# Altium schematic symbol library ICs.SchLib: 803 symbols (part 22 of 22) (continued)
## nRF52810
designator U?
MCU; Value: 64MHz; Type: QFN48 P0.4
footprint QFN_P0.5_32
part A pins: 1 DEC1, 9 VDD_1, 17 SWDCLK, 18 SWDIO, 19 ANT, 20 VSS_1, 21 DEC2, 22 DEC3, 23 XC1, 24 XC2, 25 VDD_2, 29 VSS_2, 30 DEC4, 31 DCC, 32 VDD_3, 33 PAD
part B pins: 2 P0.00/XL1, 3 P0.01/XL2, 4 P0.04/AIN2, 5 P0.05/AIN3, 6 P0.06, 7 P0.09, 8 P0.10, 10 P0.12, 11 P0.14, 12 P0.15, 13 P0.16, 14 P0.18, 15 P0.20, 16 P0.21, 26 P0.25, 27 P0.28/AIN4, 28 P0.30/AIN6

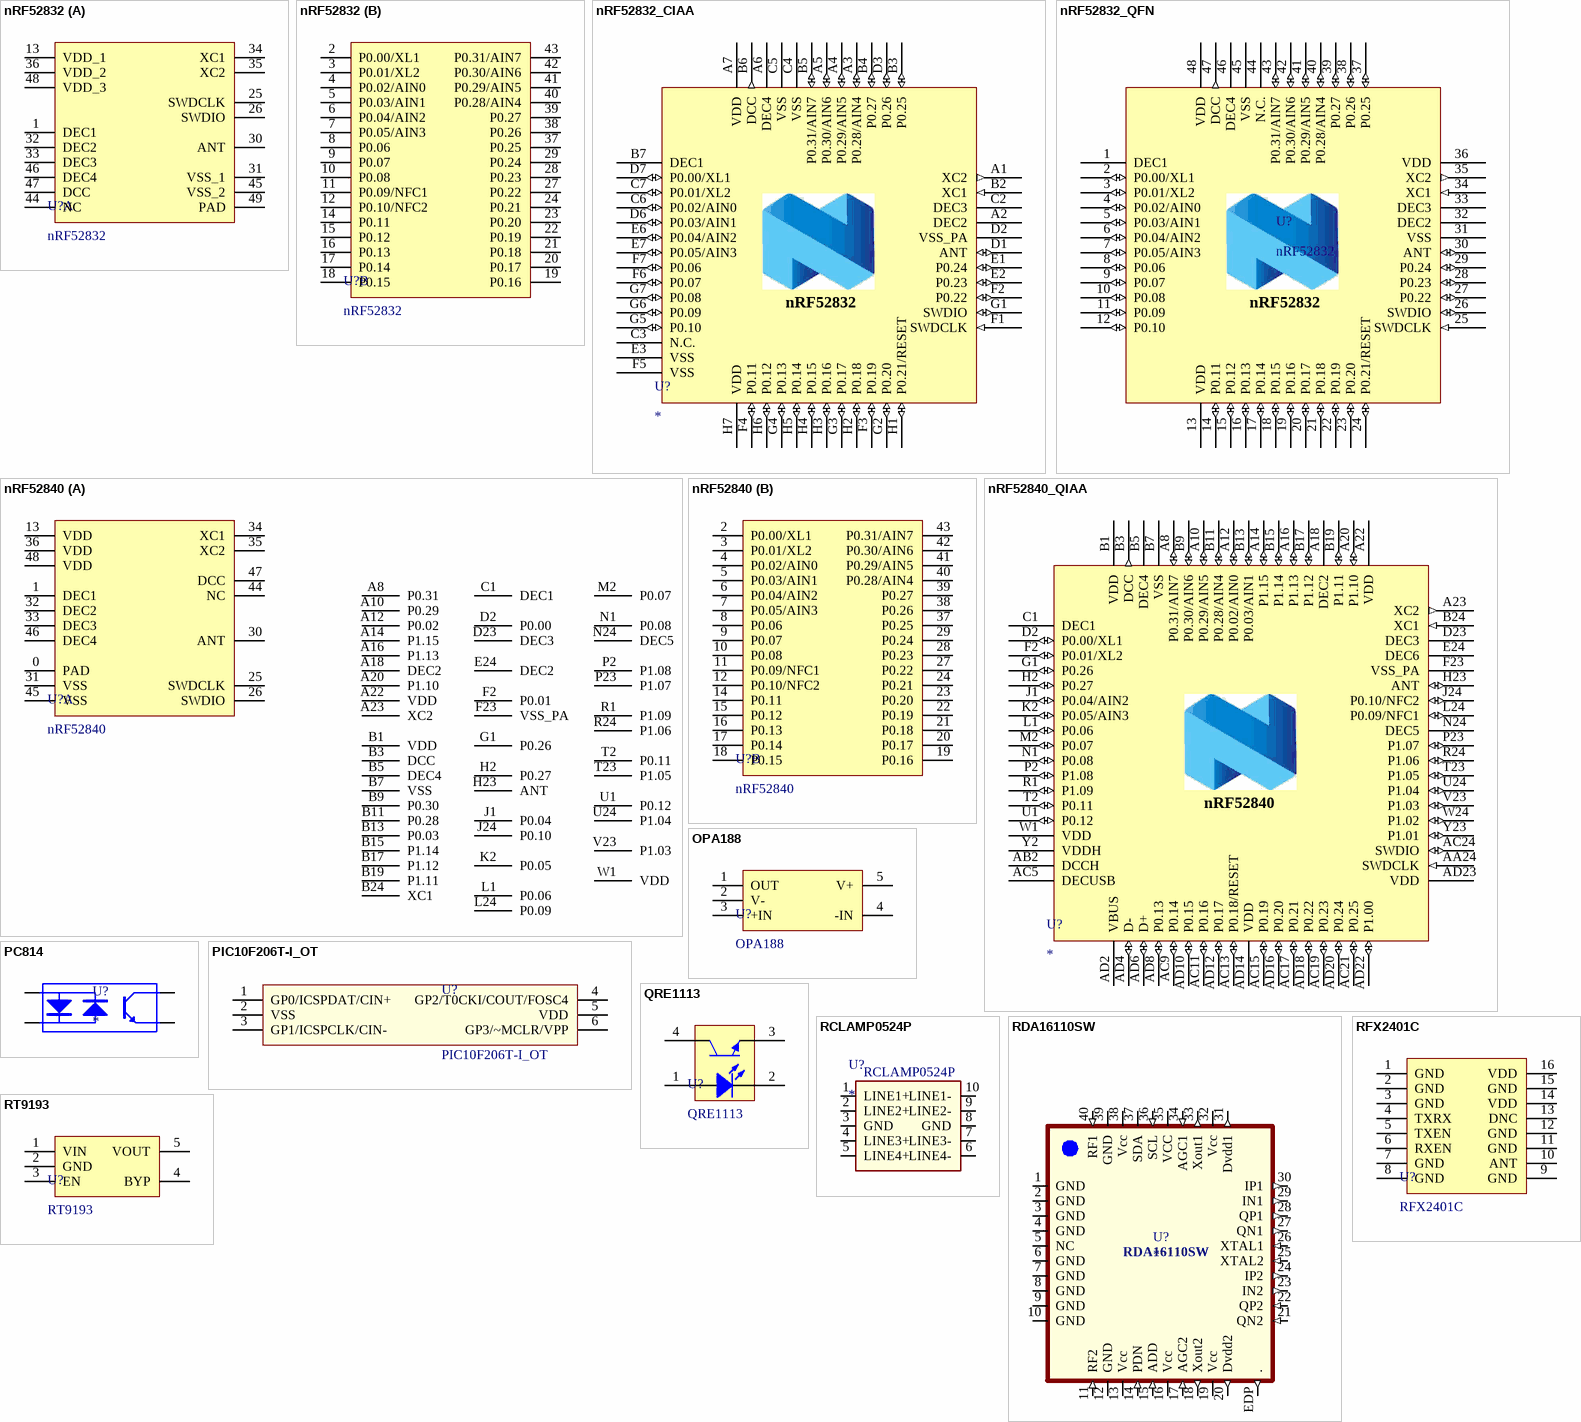
[diagram p95: symbols nRF52832 to RT9193]

## nRF52832
designator U?
MCU; Value: 64MHz; Type: QFN48 P0.4
footprint QFN_P0.4_48
part A pins: 1 DEC1, 13 VDD_1, 25 SWDCLK, 26 SWDIO, 30 ANT, 31 VSS_1, 32 DEC2, 33 DEC3, 34 XC1, 35 XC2, 36 VDD_2, 44 NC, 45 VSS_2, 46 DEC4, 47 DCC, 48 VDD_3, 49 PAD
part B pins: 2 P0.00/XL1, 3 P0.01/XL2, 4 P0.02/AIN0, 5 P0.03/AIN1, 6 P0.04/AIN2, 7 P0.05/AIN3, 8 P0.06, 9 P0.07, 10 P0.08, 11 P0.09/NFC1, 12 P0.10/NFC2, 14 P0.11, 15 P0.12, 16 P0.13, 17 P0.14, 18 P0.15, 19 P0.16, 20 P0.17, 21 P0.18, 22 P0.19, 23 P0.20, 24 P0.21, 27 P0.22, 28 P0.23, 29 P0.24, 37 P0.25, 38 P0.26, 39 P0.27, 40 P0.28/AIN4, 41 P0.29/AIN5, 42 P0.30/AIN6, 43 P0.31/AIN7

## nRF52832_CIAA
designator U?
footprint BGA50C40P7X8_295X322X50
pins: A1 XC2 (out), A2 DEC2 (power), A3 P0.28/AIN4 (io), A4 P0.29/AIN5 (io), A5 P0.30/AIN6 (io), A6 DEC4 (power), A7 VDD (power), B2 XC1 (in), B3 P0.25 (io), B4 P0.27 (io), B5 P0.31/AIN7 (io), B6 DCC (out), B7 DEC1 (power), C2 DEC3 (power), C3 N.C. (power), C4 VSS (power), C5 VSS (power), C6 P0.02/AIN0 (io), C7 P0.01/XL2 (io), D1 ANT (io), D2 VSS_PA (power), D3 P0.26 (io), D6 P0.03/AIN1 (io), D7 P0.00/XL1 (io), E1 P0.24 (io), E2 P0.23 (io), E3 VSS (power), E6 P0.04/AIN2 (io), E7 P0.05/AIN3 (io), F1 SWDCLK (in), F2 P0.22 (io), F3 P0.19 (io), F4 P0.11 (io), F5 VSS (power), F6 P0.07 (io), F7 P0.06 (io), G1 SWDIO (io), G2 P0.20 (io), G3 P0.17 (io), G4 P0.13 (io), G5 P0.10 (io), G6 P0.09 (io), G7 P0.08 (io), H1 P0.21/RESET (io), H2 P0.18 (io), H3 P0.16 (io), H4 P0.15 (io), H5 P0.14 (io), H6 P0.12 (io), H7 VDD (power)
text: nRF52832

## nRF52832_QFN
designator U?, comment nRF52832
footprint nRF52832_QFAA
pins: 1 DEC1 (power), 2 P0.00/XL1 (io), 3 P0.01/XL2 (io), 4 P0.02/AIN0 (io), 5 P0.03/AIN1 (io), 6 P0.04/AIN2 (io), 7 P0.05/AIN3 (io), 8 P0.06 (io), 9 P0.07 (io), 10 P0.08 (io), 11 P0.09 (io), 12 P0.10 (io), 13 VDD (power), 14 P0.11 (io), 15 P0.12 (io), 16 P0.13 (io), 17 P0.14 (io), 18 P0.15 (io), 19 P0.16 (io), 20 P0.17 (io), 21 P0.18 (io), 22 P0.19 (io), 23 P0.20 (io), 24 P0.21/RESET (io), 25 SWDCLK (in), 26 SWDIO (io), 27 P0.22 (io), 28 P0.23 (io), 29 P0.24 (io), 30 ANT (io), 31 VSS (power), 32 DEC2 (power), 33 DEC3 (power), 34 XC1 (in), 35 XC2 (out), 36 VDD (power), 37 P0.25 (io), 38 P0.26 (io), 39 P0.27 (io), 40 P0.28/AIN4 (io), 41 P0.29/AIN5 (io), 42 P0.30/AIN6 (io), 43 P0.31/AIN7 (io), 44 N.C. (power), 45 VSS (power), 46 DEC4 (power), 47 DCC (out), 48 VDD (power)

## nRF52840
designator U?
MCU
footprint AQFN_P0.5_73
part A pins: 0 PAD, 1 DEC1, 13 VDD, 25 SWDCLK, 26 SWDIO, 30 ANT, 31 VSS, 32 DEC2, 33 DEC3, 34 XC1, 35 XC2, 36 VDD, 44 NC, 45 VSS, 46 DEC4, 47 DCC, 48 VDD, A8 P0.31, A10 P0.29, A12 P0.02, A14 P1.15, A16 P1.13, A18 DEC2, A20 P1.10, A22 VDD, A23 XC2, B1 VDD, B3 DCC, B5 DEC4, B7 VSS, B9 P0.30, B11 P0.28, B13 P0.03, B15 P1.14, B17 P1.12, B19 P1.11, B24 XC1, C1 DEC1, D2 P0.00, D23 DEC3, E24 DEC2, F2 P0.01, F23 VSS_PA, G1 P0.26, H2 P0.27, H23 ANT, J1 P0.04, J24 P0.10, K2 P0.05, L1 P0.06, L24 P0.09, M2 P0.07, N1 P0.08, N24 DEC5, P2 P1.08, P23 P1.07, R1 P1.09, R24 P1.06, T2 P0.11, T23 P1.05, U1 P0.12, U24 P1.04, V23 P1.03, W1 VDD
part B pins: 2 P0.00/XL1, 3 P0.01/XL2, 4 P0.02/AIN0, 5 P0.03/AIN1, 6 P0.04/AIN2, 7 P0.05/AIN3, 8 P0.06, 9 P0.07, 10 P0.08, 11 P0.09/NFC1, 12 P0.10/NFC2, 14 P0.11, 15 P0.12, 16 P0.13, 17 P0.14, 18 P0.15, 19 P0.16, 20 P0.17, 21 P0.18, 22 P0.19, 23 P0.20, 24 P0.21, 27 P0.22, 28 P0.23, 29 P0.24, 37 P0.25, 38 P0.26, 39 P0.27, 40 P0.28/AIN4, 41 P0.29/AIN5, 42 P0.30/AIN6, 43 P0.31/AIN7

## nRF52840_QIAA
designator U?
footprint nRF52840_QIAA
pins: A8 P0.31/AIN7 (io), A10 P0.29/AIN5 (io), A12 P0.02/AIN0 (io), A14 P1.15 (io), A16 P1.13 (io), A18 DEC2 (power), A20 P1.10 (io), A22 VDD (power), A23 XC2 (out), AA24 SWDCLK (in), AB2 DCCH (power), AC5 DECUSB (power), AC9 P0.14 (io), AC11 P0.16 (io), AC13 P0.18/RESET (io), AC15 P0.19 (io), AC17 P0.21 (io), AC19 P0.23 (io), AC21 P0.25 (io), AC24 SWDIO (io), AD2 VBUS (power), AD4 D- (io), AD6 D+ (io), AD8 P0.13 (io), AD10 P0.15 (io), AD12 P0.17 (io), AD14 VDD (power), AD16 P0.20 (io), AD18 P0.22 (io), AD20 P0.24 (io), AD22 P1.00 (io), AD23 VDD (power), B1 VDD (power), B3 DCC (out), B5 DEC4 (power), B7 VSS (power), B9 P0.30/AIN6 (io), B11 P0.28/AIN4 (io), B13 P0.03/AIN1 (io), B15 P1.14 (io), B17 P1.12 (io), B19 P1.11 (io), B24 XC1 (in), C1 DEC1 (power), D2 P0.00/XL1 (io), D23 DEC3 (power), E24 DEC6 (power), F2 P0.01/XL2 (io), F23 VSS_PA (power), G1 P0.26 (io), H2 P0.27 (io), H23 ANT (io), J1 P0.04/AIN2 (io), J24 P0.10/NFC2 (io), K2 P0.05/AIN3 (io), L1 P0.06 (io), L24 P0.09/NFC1 (io), M2 P0.07 (io), N1 P0.08 (io), N24 DEC5 (power), P2 P1.08 (io), P23 P1.07 (io), R1 P1.09 (io), R24 P1.06 (io), T2 P0.11 (io), T23 P1.05 (io), U1 P0.12 (io), U24 P1.04 (io), V23 P1.03 (io), W1 VDD (power), W24 P1.02 (io), Y2 VDDH (power), Y23 P1.01 (io)
text: nRF52840

## OPA188
designator U?
OP
footprint SOT23-5
pins: 1 OUT, 2 V-, 3 +IN, 4 -IN, 5 V+

## PC814
designator U?
footprint SMT-4
pins: 1 A "Anode", 2 K "Cathode", 3 E "Emitter", 4 C "Collector"

## PIC10F206T-I_OT
designator U?
8-bit Flash Microcontroller; Manufacturer_Name: Microchip; Manufacturer_Part_Number: PIC10F206T-I/OT; Allied_Number: 70046211; RS Part Number: 2508408815; RS Price/Stock: http://uk.rs-online.com/web/p/products/2508408815; Allied Price/Stock: https://www.alliedelec.com/microchip-technology-inc-pic10f206t-i-ot/70046211/; Arrow Part Number: PIC10F206T-I/OT; Arrow Price/Stock: https://www.arrow.com/en/products/pic10f206t-iot/microchip-technology; Datasheet Link: *
footprint SOT23-6N
pins: 1 GP0/ICSPDAT/CIN+, 2 VSS, 3 GP1/ICSPCLK/CIN-, 4 GP2/T0CKI/COUT/FOSC4, 5 VDD, 6 GP3/~MCLR/VPP

## QRE1113
designator U?
Sensor IR
footprint QRE1113GR
pins: 1 A, 2 C, 3 E, 4 C

## RCLAMP0524P
designator U?
footprint RCLAMP0524P
pins: 1 LINE1+, 2 LINE2+, 3 GND (power), 4 LINE3+, 5 LINE4+, 6 LINE4-, 7 LINE3-, 8 GND (power), 9 LINE2-, 10 LINE1-

## RDA16110SW
designator U?
footprint QFN40
pins: 1 GND (power), 2 GND (power), 3 GND (power), 4 GND (power), 5 NC, 6 GND (power), 7 GND (power), 8 GND (power), 9 GND (power), 10 GND (power), 11 RF2 (in), 12 GND (power), 13 Vcc (power), 14 PDN (in), 15 ADD (in), 16 Vcc (power), 17 AGC2 (in), 18 Xout2 (out), 19 Vcc (power), 20 Dvdd2 (out), 21 QN2 (in), 22 QP2 (in), 23 IN2 (out), 24 IP2 (out), 25 XTAL2 (in), 26 XTAL1 (in), 27 QN1 (out), 28 QP1 (out), 29 IN1 (out), 30 IP1 (out), 31 Dvdd1 (out), 32 Vcc (power), 33 Xout1 (out), 34 AGC1 (in), 35 VCC (power), 36 SCL (in), 37 SDA (io), 38 Vcc (power), 39 GND (power), 40 RF1 (in), EDP . (out)

## RFX2401C
designator U?
Radio PA/LNA; Type: QFN16 P0.5
footprint QFN_P0.5_16
pins: 1 GND, 2 GND, 3 GND, 4 TXRX, 5 TXEN, 6 RXEN, 7 GND, 8 GND, 9 GND, 10 ANT, 11 GND, 12 GND, 13 DNC, 14 VDD, 15 GND, 16 VDD

## RT9193
designator U?
Power; Value: 3V3; Type: SOT23-5
footprint SOT23-5
pins: 1 VIN, 2 GND, 3 EN (power), 4 BYP, 5 VOUT

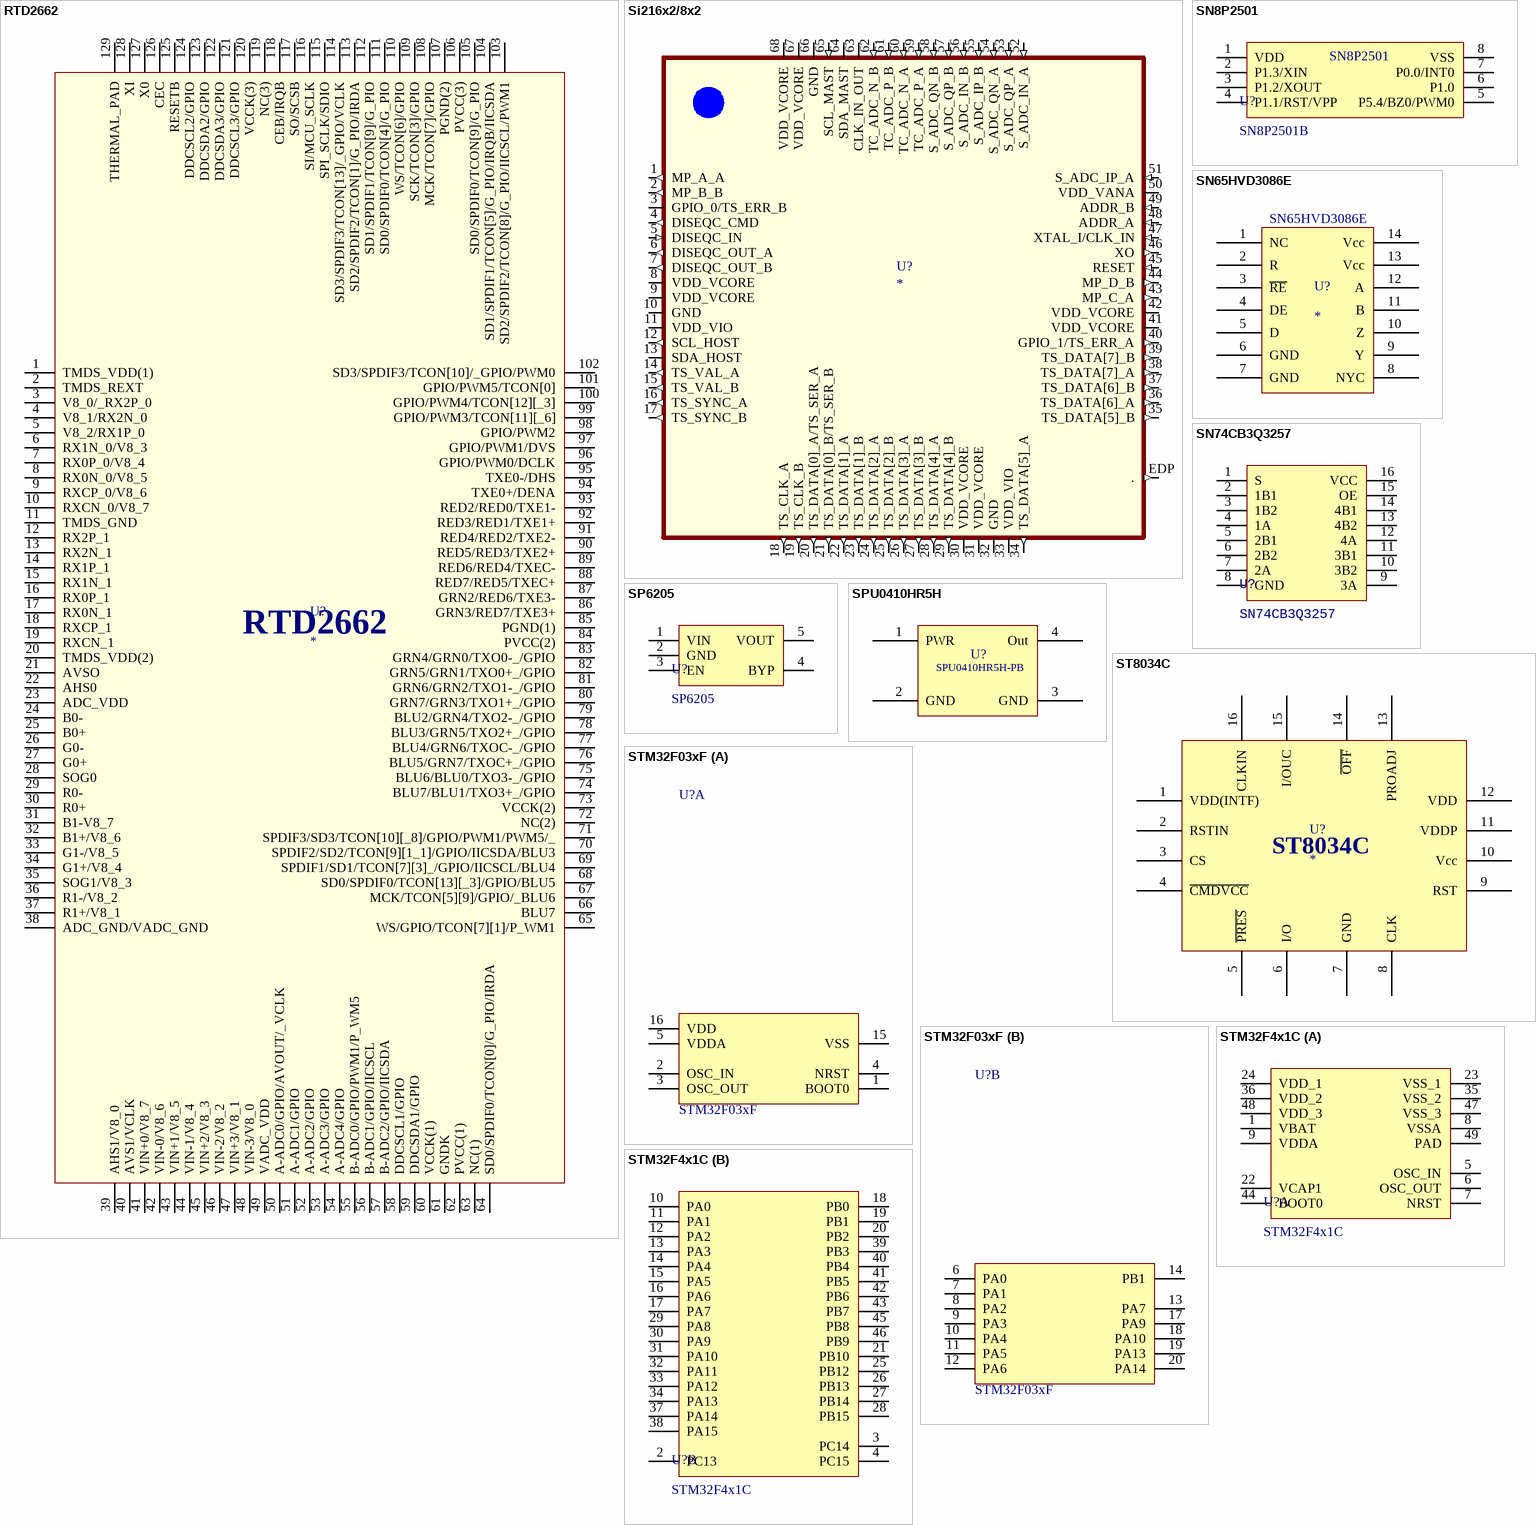
[diagram p96: symbols RTD2662 to STM32F4x1C]

## RTD2662
designator U?
footprint QFP128
pins: 1 TMDS_VDD(1), 2 TMDS_REXT, 3 V8_0/_RX2P_0, 4 V8_1/RX2N_0, 5 V8_2/RX1P_0, 6 RX1N_0/V8_3, 7 RX0P_0/V8_4, 8 RX0N_0/V8_5, 9 RXCP_0/V8_6, 10 RXCN_0/V8_7, 11 TMDS_GND, 12 RX2P_1, 13 RX2N_1, 14 RX1P_1, 15 RX1N_1, 16 RX0P_1, 17 RX0N_1, 18 RXCP_1, 19 RXCN_1, 20 TMDS_VDD(2), 21 AVSO, 22 AHS0, 23 ADC_VDD, 24 B0-, 25 B0+, 26 G0-, 27 G0+, 28 SOG0, 29 R0-, 30 R0+, 31 B1-V8_7, 32 B1+/V8_6, 33 G1-/V8_5, 34 G1+/V8_4, 35 SOG1/V8_3, 36 R1-/V8_2, 37 R1+/V8_1, 38 ADC_GND/VADC_GND, 39 AHS1/V8_0, 40 AVS1/VCLK, 41 VIN+0/V8_7, 42 VIN-0/V8_6, 43 VIN+1/V8_5, 44 VIN-1/V8_4, 45 VIN+2/V8_3, 46 VIN-2/V8_2, 47 VIN+3/V8_1, 48 VIN-3/V8_0, 49 VADC_VDD, 50 A-ADC0/GPIO/AVOUT/_VCLK, 51 A-ADC1/GPIO, 52 A-ADC2/GPIO, 53 A-ADC3/GPIO, 54 A-ADC4/GPIO, 55 B-ADC0/GPIO/PWM1/P_WM5, 56 B-ADC1/GPIO/IICSCL, 57 B-ADC2/GPIO/IICSDA, 58 DDCSCL1/GPIO, 59 DDCSDA1/GPIO, 60 VCCK(1), 61 GNDK, 62 PVCC(1), 63 NC(1), 64 SD0/SPDIF0/TCON[0]/G_PIO/IRDA, 65 WS/GPIO/TCON[7][1]/P_WM1, 66 BLU7, 67 MCK/TCON[5][9]/GPIO/_BLU6, 68 SD0/SPDIF0/TCON[13][_3]/GPIO/BLU5, 69 SPDIF1/SD1/TCON[7][3]_/GPIO/IICSCL/BLU4, 70 SPDIF2/SD2/TCON[9][1_1]/GPIO/IICSDA/BLU3, 71 SPDIF3/SD3/TCON[10][_8]/GPIO/PWM1/PWM5/_, 72 NC(2), 73 VCCK(2), 74 BLU7/BLU1/TXO3+_/GPIO, 75 BLU6/BLU0/TXO3-_/GPIO, 76 BLU5/GRN7/TXOC+_/GPIO, 77 BLU4/GRN6/TXOC-_/GPIO, 78 BLU3/GRN5/TXO2+_/GPIO, 79 BLU2/GRN4/TXO2-_/GPIO, 80 GRN7/GRN3/TXO1+_/GPIO, 81 GRN6/GRN2/TXO1-_/GPIO, 82 GRN5/GRN1/TXO0+_/GPIO, 83 GRN4/GRN0/TXO0-_/GPIO, 84 PVCC(2), 85 PGND(1), 86 GRN3/RED7/TXE3+, 87 GRN2/RED6/TXE3-, 88 RED7/RED5/TXEC+, 89 RED6/RED4/TXEC-, 90 RED5/RED3/TXE2+, 91 RED4/RED2/TXE2-, 92 RED3/RED1/TXE1+, 93 RED2/RED0/TXE1-, 94 TXE0+/DENA, 95 TXE0-/DHS, 96 GPIO/PWM0/DCLK, 97 GPIO/PWM1/DVS, 98 GPIO/PWM2, 99 GPIO/PWM3/TCON[11][_6], 100 GPIO/PWM4/TCON[12][_3], 101 GPIO/PWM5/TCON[0], 102 SD3/SPDIF3/TCON[10]/_GPIO/PWM0, 103 SD2/SPDIF2/TCON[8]/G_PIO/IICSCL/PWM1, 104 SD1/SPDIF1/TCON[5]/G_PIO/IRQB/IICSDA, 105 SD0/SPDIF0/TCON[9]/G_PIO, 106 PVCC(3), 107 PGND(2), 108 MCK/TCON[7]/GPIO, 109 SCK/TCON[3]/GPIO, 110 WS/TCON[6]/GPIO, 111 SD0/SPDIF0/TCON[4]/G_PIO, 112 SD1/SPDIF1/TCON[9]/G_PIO, 113 SD2/SPDIF2/TCON[1]/G_PIO/IRDA, 114 SD3/SPDIF3/TCON[13]/_GPIO/VCLK, 115 SPI_SCLK/SDIO, 116 SI/MCU_SCLK, 117 SO/SCSB, 118 CEB/IRQB, 119 NC(3), 120 VCCK(3), 121 DDCSCL3/GPIO, 122 DDCSDA3/GPIO, 123 DDCSDA2/GPIO, 124 DDCSCL2/GPIO, 125 RESETB, 126 CEC, 127 X0, 128 XI, 129 THERMAL_PAD

## Si216x2/8x2
designator U?
footprint PQFN-68 (PQFN, 68-Leads, Body 7.95x7.95mm, Pitch 0.39mm/0.40mm, Thermal Pad 5.00x5.00mm, IPC Medium Density)
pins: 1 MP_A_A (out), 2 MP_B_B (out), 3 GPIO_0/TS_ERR_B (io), 4 DISEQC_CMD (out), 5 DISEQC_IN (in), 6 DISEQC_OUT_A (out), 7 DISEQC_OUT_B (out), 8 VDD_VCORE (power), 9 VDD_VCORE (power), 10 GND (power), 11 VDD_VIO (power), 12 SCL_HOST (out), 13 SDA_HOST (io), 14 TS_VAL_A (out), 15 TS_VAL_B (out), 16 TS_SYNC_A (out), 17 TS_SYNC_B (out), 18 TS_CLK_A (out), 19 TS_CLK_B (out), 20 TS_DATA[0]_A/TS_SER_A (out), 21 TS_DATA[0]_B/TS_SER_B (out), 22 TS_DATA[1]_A (out), 23 TS_DATA[1]_B (out), 24 TS_DATA[2]_A (out), 25 TS_DATA[2]_B (out), 26 TS_DATA[3]_A (out), 27 TS_DATA[3]_B (out), 28 TS_DATA[4]_A (out), 29 TS_DATA[4]_B (out), 30 VDD_VCORE (power), 31 VDD_VCORE (power), 32 GND (power), 33 VDD_VIO (power), 34 TS_DATA[5]_A (out), 35 TS_DATA[5]_B (out), 36 TS_DATA[6]_A (out), 37 TS_DATA[6]_B (out), 38 TS_DATA[7]_A (out), 39 TS_DATA[7]_B (out), 40 GPIO_1/TS_ERR_A (out), 41 VDD_VCORE (power), 42 VDD_VCORE (power), 43 MP_C_A (out), 44 MP_D_B (out), 45 RESET (in), 46 XO (out), 47 XTAL_I/CLK_IN (in), 48 ADDR_A (in), 49 ADDR_B (in), 50 VDD_VANA (power), 51 S_ADC_IP_A (in), 52 S_ADC_IN_A (in), 53 S_ADC_QP_A (in), 54 S_ADC_QN_A (in), 55 S_ADC_IP_B (in), 56 S_ADC_IN_B (in), 57 S_ADC_QP_B (in), 58 S_ADC_QN_B (in), 59 TC_ADC_P_A (in), 60 TC_ADC_N_A (in), 61 TC_ADC_P_B (in), 62 TC_ADC_N_B (in), 63 CLK_IN_OUT (io), 64 SDA_MAST (io), 65 SCL_MAST (in), 66 GND (power), 67 VDD_VCORE (power), 68 VDD_VCORE (power), EDP . (out)

## SN8P2501
designator U?, comment SN8P2501B
footprint SOP-8
pins: 1 VDD, 2 P1.3/XIN, 3 P1.2/XOUT, 4 P1.1/RST/VPP, 5 P5.4/BZ0/PWM0, 6 P1.0, 7 P0.0/INT0, 8 VSS

## SN65HVD3086E
designator U?
pins: 1 NC, 2 R, 3 ~{RE}, 4 DE, 5 D, 6 GND, 7 GND, 8 NYC, 9 Y, 10 Z, 11 B, 12 A, 13 Vcc, 14 Vcc
